# Altium footprint library PcbLib1.PcbLib: 148 footprints (part 3 of 10)
Each footprint in its own frame and in the unit in brackets; x right, y up, seen from the top. Pads: shape width x height; smd on the part's side, far side on the other; paste and mask are expansions set on the pad; w line width, h text height; cw(c..) or ccw(c..) is an arc to the next point about the centre after c.
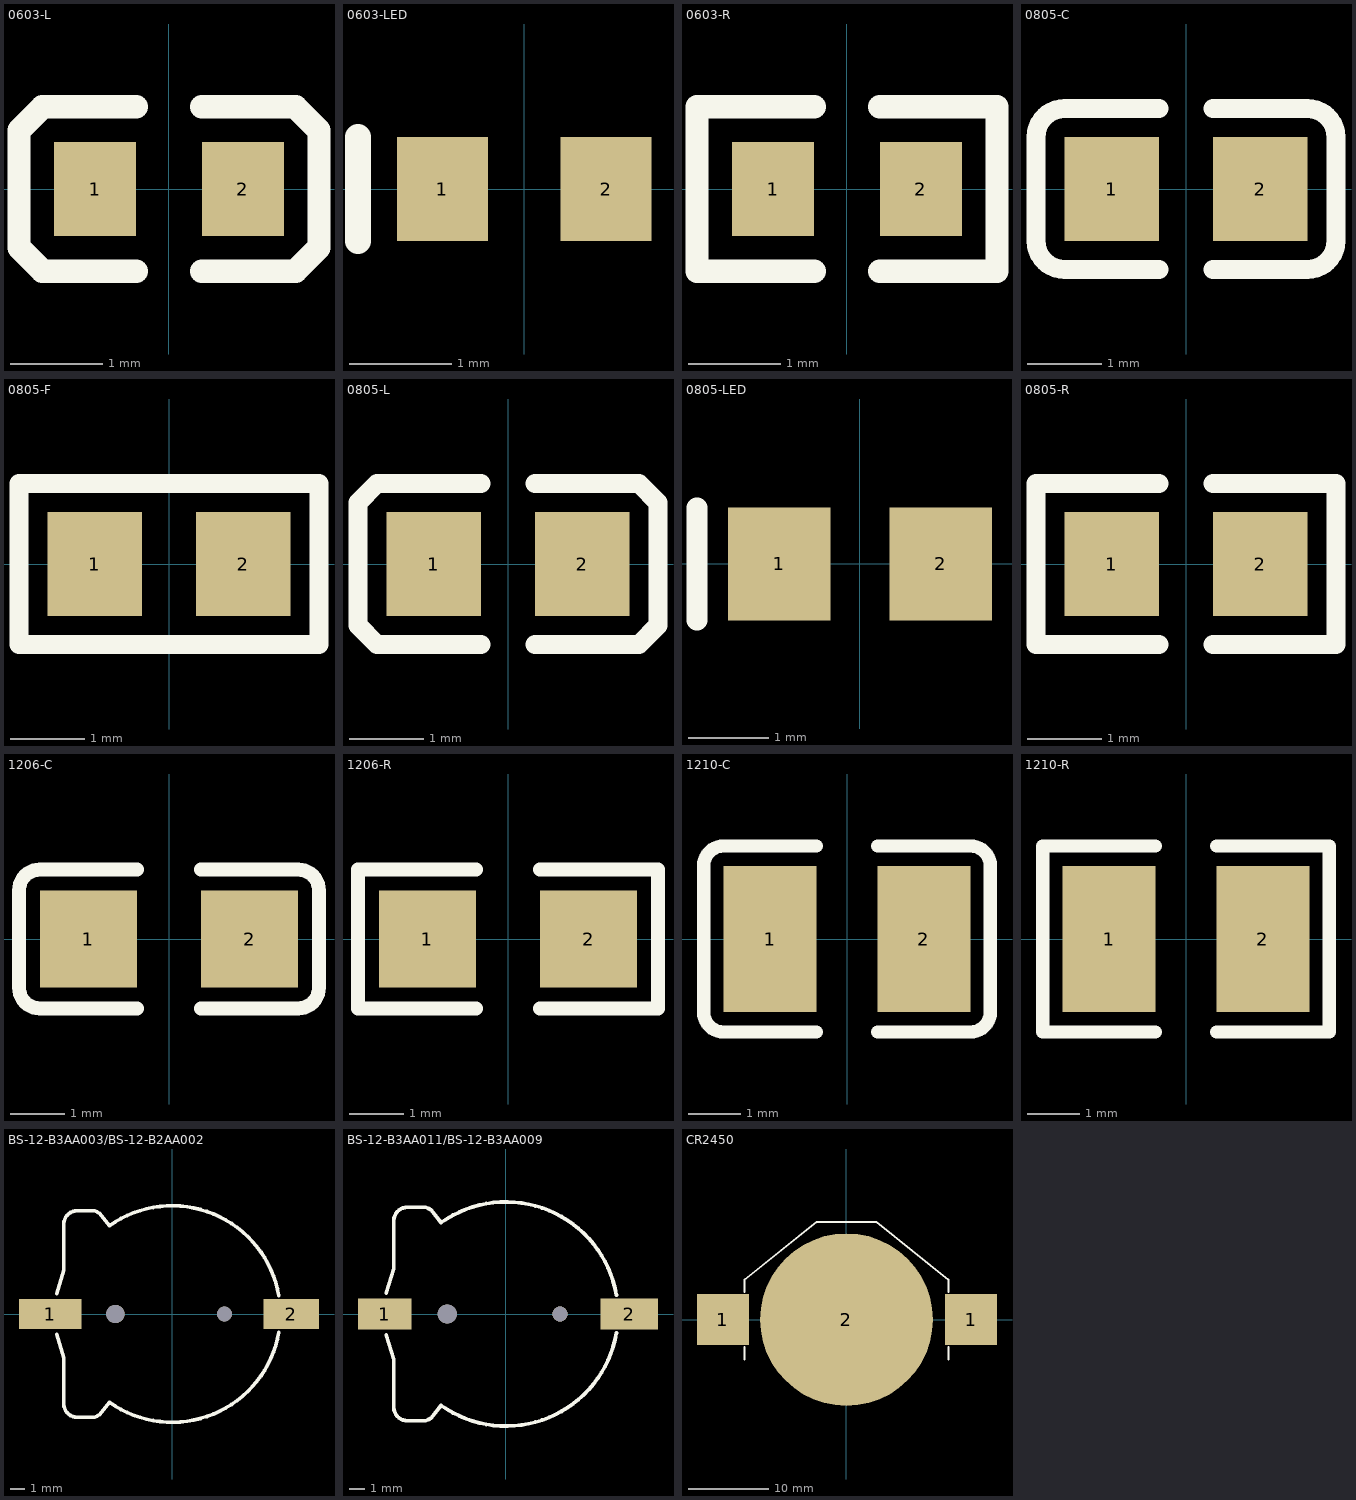
[diagram p2: the footprints below, top view; thin cyan lines are the x and y axes]

## 0603-L [mil]
pads (2):
  rect 35x40 smd: 1(-31.5,0) 2(31.5,0)
Top Overlay:
  lines w10: -14,-35 -54,-35 -64,-25 -64,25 -54,35 -14,35 ; 14,-35 54,-35 64,-25 64,25 54,35 14,35

## 0603-LED [mil]
pads (2):
  rect 35x40 smd: 1(-31.5,0) 2(31.5,0)
Top Overlay:
  lines w10: -64,-20 -64,20
3D body "0603-LED.step": height 26.76, standoff 0.19, extent -32.48,-14.06 32.48,14.48

## 0603-R [mil]
pads (2):
  rect 35x40 smd: 1(-31.5,0) 2(31.5,0)
Top Overlay:
  lines w10: -14,-35 -64,-35 -64,35 -14,35 ; 14,-35 64,-35 64,35 14,35
3D body "0603-R.step": height 32.99, standoff 0, extent -34.84,-18.7 34.84,18.7

## 0805-C [mil]
pads (2):
  rect 50x55 smd: 1(-39.37,0) 2(39.37,0)
Top Overlay:
  lines w10: -14.37,-42.5 -64.37,-42.5 cw(c-64.37,-27.5) -79.37,-27.5 -79.37,27.5 cw(c-64.37,27.5) -64.37,42.5 -14.37,42.5 ; 14.37,-42.5 64.37,-42.5 ccw(c64.37,-27.5) 79.37,-27.5 79.37,27.5 ccw(c64.37,27.5) 64.37,42.5 14.37,42.5
3D body "0805-C.step": height 49.02, standoff 0, extent -40,-25 40,25

## 0805-F [mil]
pads (2):
  rect 50x55 smd: 1(-39.37,0) 2(39.37,0)
Top Overlay:
  lines w10: -79.37,-42.5 79.37,-42.5 79.37,42.5 -79.37,42.5 -79.37,-42.5

## 0805-L [mil]
pads (2):
  rect 50x55 smd: 1(-39.37,0) 2(39.37,0)
Top Overlay:
  lines w10: -14.37,-42.5 -69.37,-42.5 -79.37,-32.5 -79.37,32.5 -69.37,42.5 -14.37,42.5 ; 14.37,-42.5 69.37,-42.5 79.37,-32.5 79.37,32.5 69.37,42.5 14.37,42.5

## 0805-LED [mil]
pads (2):
  rect 50x55 smd: 1(-39.37,0) 2(39.37,0)
Top Overlay:
  lines w10: -79.37,-27.5 -79.37,27.5
3D body "0805-LED.step": height 33.45, standoff 0.23, extent -40.6,-17.58 40.6,18.1

## 0805-R [mil]
pads (2):
  rect 50x55 smd: 1(-39.37,0) 2(39.37,0)
Top Overlay:
  lines w10: -14.37,-42.5 -79.37,-42.5 -79.37,42.5 -14.37,42.5 ; 14.37,-42.5 79.37,-42.5 79.37,42.5 14.37,42.5
3D body "0805-R.step": height 27.99, standoff 0, extent -39.37,-23.62 39.37,23.62

## 1206-C [mil]
pads (2):
  rect 70x70 smd: 1(-57.99,0) 2(57.99,0)
Top Overlay:
  lines w10: -22.99,-50 -92.99,-50 cw(c-92.99,-35) -107.99,-35 -107.99,35 cw(c-92.99,35) -92.99,50 -22.99,50 ; 22.99,-50 92.99,-50 ccw(c92.99,-35) 107.99,-35 107.99,35 ccw(c92.99,35) 92.99,50 22.99,50
3D body "1206-C.step": height 37.01, standoff 0, extent -67.01,-35.51 67.01,35.51

## 1206-R [mil]
pads (2):
  rect 70x70 smd: 1(-57.99,0) 2(57.99,0)
Top Overlay:
  lines w10: -22.99,-50 -107.99,-50 -107.99,50 -22.99,50 ; 22.99,-50 107.99,-50 107.99,50 22.99,50
3D body "1206-R.step": height 27.99, standoff 0, extent -62.99,-31.5 62.99,31.5

## 1210-C [mil]
pads (2):
  rect 70x110 smd: 1(-57.99,0) 2(57.99,0)
Top Overlay:
  lines w10: -22.99,-70 -92.99,-70 cw(c-92.99,-55) -107.99,-55 -107.99,55 cw(c-92.99,55) -92.99,70 -22.99,70 ; 22.99,-70 92.99,-70 ccw(c92.99,-55) 107.99,-55 107.99,55 ccw(c92.99,55) 92.99,70 22.99,70
3D body "1210-C.step": height 27.99, standoff 0, extent -67.01,-52.99 67.01,52.99

## 1210-R [mil]
pads (2):
  rect 70x110 smd: 1(-57.99,0) 2(57.99,0)
Top Overlay:
  lines w10: -22.99,-70 -107.99,-70 -107.99,70 -22.99,70 ; 22.99,-70 107.99,-70 107.99,70 22.99,70
3D body "1210-R.step": height 27.99, standoff 0, extent -62.99,-49.21 62.99,49.21

## 1812 [mil]

## BS-12-B3AA003/BS-12-B2AA002 [mil] "CR1220 Battery Holder"
pads (4):
  rect 170x80 smd mask+4: 1(-329.88,0)
  rect 150x80 smd mask+4: 2(322.99,0)
  round 50 hole 50 unplated: ""(-153.54,0)
  round 40 hole 40 unplated: ""(141.73,0)
Top Overlay:
  lines w10: -312.99,-55 -293.31,-118 -293.31,-244.53 ccw(c-257.89,-244.11) -257.47,-279.53 -210.12,-279.53 ccw(c-233.8,-215.73) -196.53,-272.67 -170,-239.41 ; -312.99,55 -293.31,118 -293.31,244.53 cw(c-257.89,244.11) -257.47,279.53 -210.12,279.53 cw(c-233.8,215.73) -196.53,272.67 -170,239.41 ; -169.67,-239.25 ccw(c0,0) 289.01,-50 ; -169.67,239.25 cw(c0,0) 289.01,50
3D body "BS-1220-2 PPS(BS-12-B3AA003）总装体.STEP.step": height 173.09, standoff -27.7, extent -385.59,-293.14 372.29,293.16

## BS-12-B3AA011/BS-12-B3AA009 [mil] "CR1220 Battery Holder"
pads (4):
  rect 140x80 smd mask+4: 1(-317.09,0)
  rect 150x80 smd mask+4: 2(322.99,0)
  round 50 hole 50 unplated: ""(-153.54,0)
  round 40 hole 40 unplated: ""(141.73,0)
Top Overlay:
  lines w10: -312.99,-55 -293.31,-118 -293.31,-244.53 ccw(c-257.89,-244.11) -257.47,-279.53 -210.12,-279.53 ccw(c-233.8,-215.73) -196.53,-272.67 -170,-239.41 ; -312.99,55 -293.31,118 -293.31,244.53 cw(c-257.89,244.11) -257.47,279.53 -210.12,279.53 cw(c-233.8,215.73) -196.53,272.67 -170,239.41 ; -169.67,-239.25 ccw(c0,0) 289.01,-50 ; -169.67,239.25 cw(c0,0) 289.01,50
3D body "BS-12-B3AA011.step": height 171.26, standoff -31.5, extent -360.24,-293.16 372.05,293.16

## CR2450 [mil]
pads (3):
  rect 255x250 smd: 1(-608.35,0) 1(613.35,0)
  round 850 smd: 2(0,0)
Top Overlay:
  lines w10: -501.97,-196.85 -501.97,-135 ; -501.97,135 -501.97,196.85 -147.64,480.31 147.64,480.31 501.97,196.85 501.97,135 ; 501.97,-196.85 501.97,-135